# Altium footprint library Cty1.PcbLib: 869 footprints (part 10 of 55)
Each footprint in its own frame and in the unit in brackets; x right, y up, seen from the top. Pads: shape width x height; smd on the part's side, far side on the other; paste and mask are expansions set on the pad; w line width, h text height; cw(c..) or ccw(c..) is an arc to the next point about the centre after c.
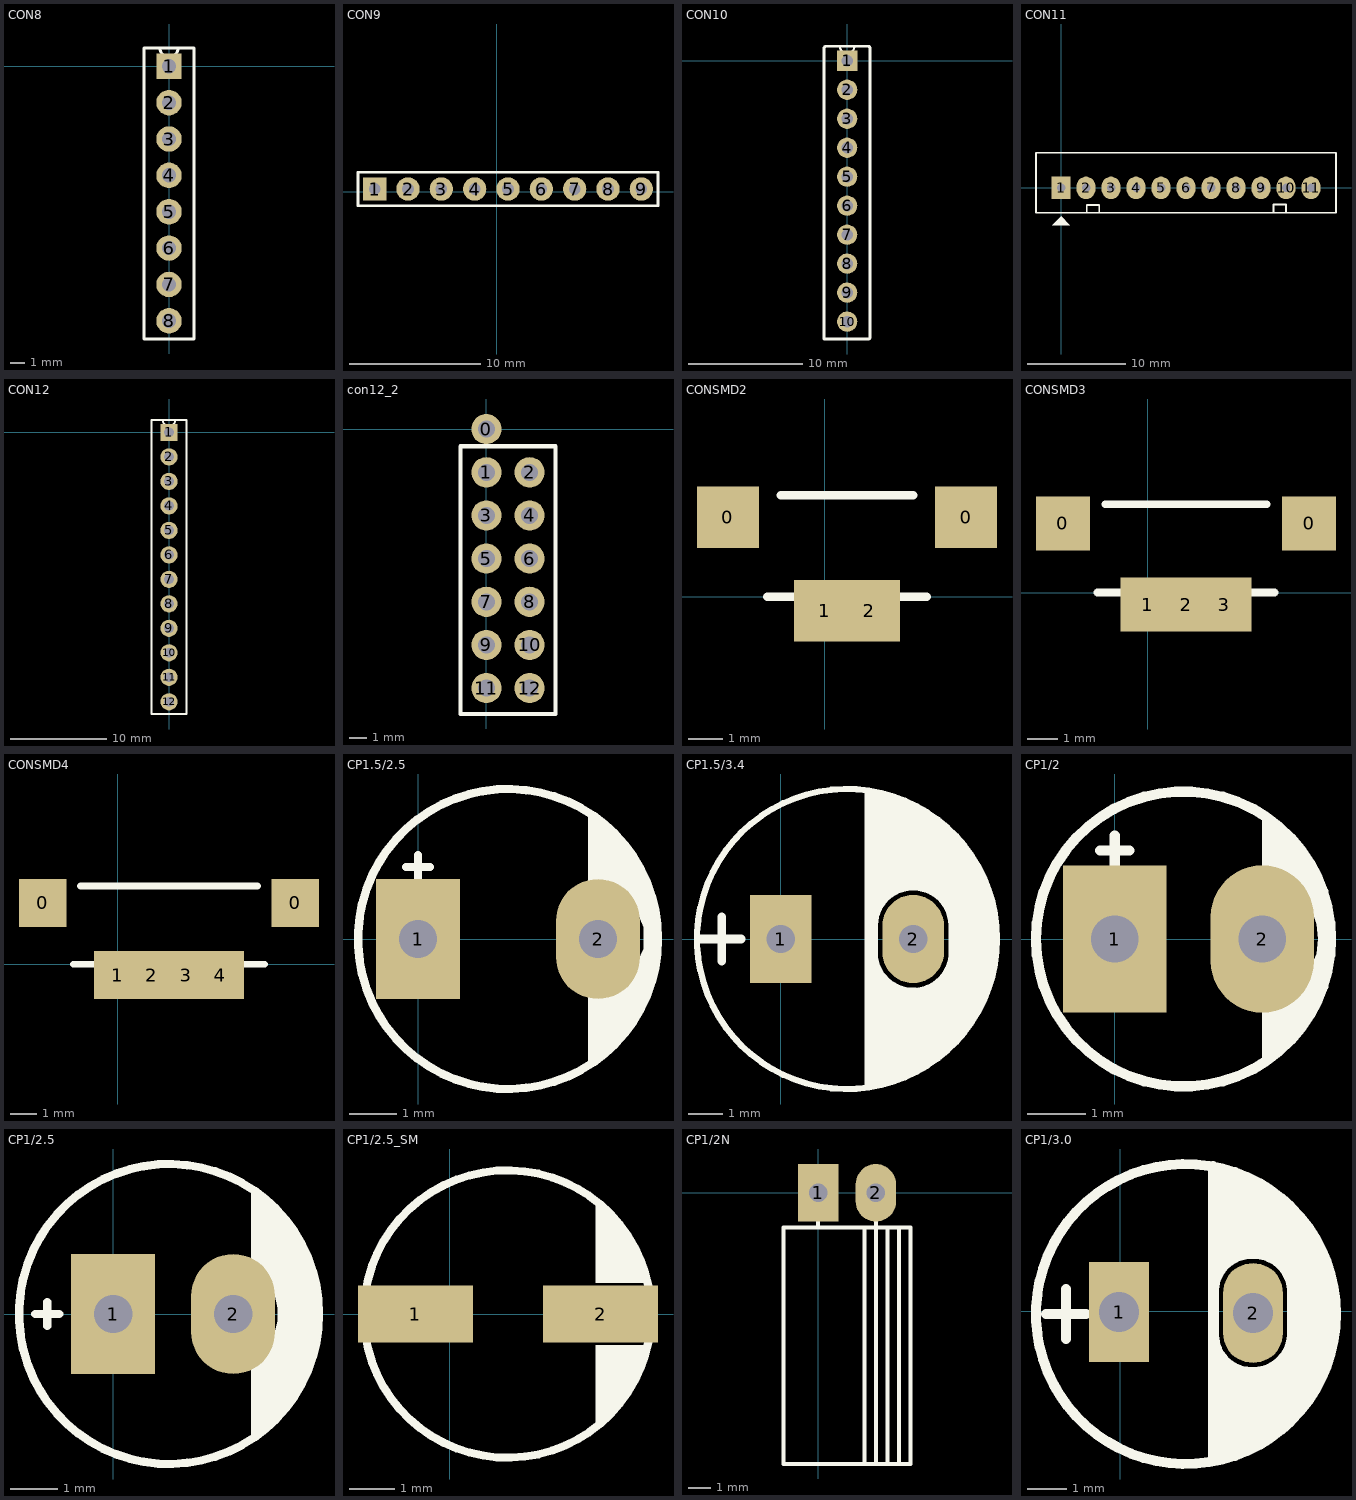
[diagram p9: the footprints below, top view; thin cyan lines are the x and y axes]

## CON8 [mil]
pads (8):
  rect 70x70 hole 39.37 unplated: 1(0,0)
  round 70 hole 39.37 unplated: 2(0,-100) 3(0,-200) 4(0,-300) 5(0,-400) 6(0,-500) 7(0,-600) 8(0,-700)
Top Overlay:
  lines w7.87: -68.31,-750 68.31,-750 68.31,50 -25,50 ccw(c0,50) 25,50 -68.31,50 -68.31,-750

## CON9 [mil]
pads (9):
  rect 70x70 hole 35 unplated: 1(-365.83,8.58)
  round 70 hole 35 unplated: 2(-265.83,8.58) 3(-165.83,8.58) 4(-65.83,8.58) 5(34.17,8.58) 6(134.17,8.58) 7(234.17,8.58) 8(334.17,8.58) 9(434.17,8.58)
Top Overlay:
  lines w7.87: -415.83,-41.42 484.17,-41.42 484.17,58.58 -415.83,58.58 -415.83,-41.42

## CON10 [mil]
pads (10):
  rect 70x70 hole 39.37 unplated: 1(0,0)
  round 70 hole 39.37 unplated: 2(0,-100) 3(0,-200) 4(0,-300) 5(0,-400) 6(0,-500) 7(0,-600) 8(0,-700) 9(0,-800) 10(0,-900)
Top Overlay:
  lines w7.87: -80,-960 60,-960 ; -72.24,50 25,50 cw(c0,50) -25,50 72.24,50
  lines w10: -72.24,50 ccw(c-72.24,42.24) -80,42.24 -80,-960 73.46,-960 ccw(c73.46,-954.72) 78.74,-954.72 78.74,43.5 ccw(c72.24,43.5) 72.24,50

## CON11 [mil] "CON11"
height 200
pads (11):
  rect 75x90 hole 34: 1(0,0)
  oval 75x90 hole 34: 2(100,0) 3(200,0) 4(300,0) 5(400,0) 6(500,0) 7(600,0) 8(700,0) 9(800,0) 10(900,0) 11(1000,0)
Top Overlay:
  region: -35.5,-149.5 35.5,-149.5 0.5,-114.5 0.5,-113.5
  lines w7: 103,-99 103,-69 153,-69 153,-99 ; 850,-97 850,-67 900,-67 900,-97 ; -100,-100 -100,140 1100,140 1100,0 1100,-100 -100,-100

## CON12 [mil]
pads (12):
  rect 70x70 hole 39.37 unplated: 1(0,0)
  round 70 hole 39.37 unplated: 2(0,-100) 3(0,-200) 4(0,-300) 5(0,-400) 6(0,-500) 7(0,-600) 8(0,-700) 9(0,-800) 10(0,-900) 11(0,-1000) 12(0,-1100)
Top Overlay:
  lines w7.87: -72.24,-1150 72.24,-1150 72.24,50 -25,50 ccw(c0,50) 25,50 -72.24,50 -72.24,-1150

## con12_2 [mil]
pads (13):
  round 70 hole 39.37 unplated: 0(0,0) 1(0,-100) 2(100,-100) 3(0,-200) 4(100,-200) 5(0,-300) 6(100,-300) 7(0,-400) 8(100,-400) 9(0,-500) 10(100,-500) 11(0,-600) 12(100,-600)
Top Overlay:
  lines w10: -60,-660 160,-660 160,-40 -60,-40 -60,-660

## CONSMD2 [mil]
pads (4):
  rect 70x70 smd: 0(-110,90) 0(160,90) 1(0,-15.75) 2(50,-15.75)
Top Overlay:
  lines w10: -65,0 -30,0 ; -50,115 100,115 ; 80,0 115,0

## CONSMD3 [mil]
pads (5):
  rect 70x70 smd: 0(-110,90) 0(210,90) 1(0,-15.75) 2(50,-15.75) 3(100,-15.75)
Top Overlay:
  lines w10: -65,0 -30,0 ; -55,115 155,115 ; 130,0 165,0

## CONSMD4 [mil]
pads (6):
  rect 70x70 smd: 0(-110,90) 0(260,90) 1(0,-15.75) 2(50,-15.75) 3(100,-15.75) 4(150,-15.75)
Top Overlay:
  lines w10: -65,0 -30,0 ; -55,115 205,115 ; 180,0 215,0

## CP1.5/2.5 [mil] "Tu hoa 33 >100 uF,50V, 220uF/16V,25V ( it su dung )"
height 300
pads (2):
  rect 70x100 hole 32: 1(0,0)
  oval 70x100 hole 32: 2(150,0)
Top Overlay:
  circle w7: c75,0 r125
  region: 142,106 142,39 156,39 173,35 182,25 188,10 188,-8 183,-19 183,-19.53 171,-33 155,-38 142,-41 142,-107 156,-96 177,-72 194,-40 199,-14 200,0 198,24 189,50 175,74 160,93
  lines w7: -10,60 10,60 ; 0,50 0,70
3D body: height 433.67, standoff -747.43, extent -46,-121.02 202.03,127.02

## CP1.5/3.4 [mil] "Tu hoa 220->470uF,16V, 470uF/16V,25V"
height 300
pads (2):
  rect 70x100 hole 32: 1(0,0)
  oval 70x100 hole 32: 2(150,0)
Top Overlay:
  circle w7: c75,0 r170
  region: 100,25 135,60 162.93,60 164.61,60 169.59,59.01 173.81,56.19 175,55 181.46,48.54 183.16,46.84 185,41.19 185,40 190,35 191.19,33.81 194.01,29.59 195,24.61 195,22.93 195,-27.93 195,-29.61 194.01,-34.59 191.19,-38.81 190,-40 178.54,-51.46 177.69,-52.31 174.71,-54.3 171.19,-55 170,-55 168.81,-56.19 164.59,-59.01 159.61,-60 157.93,-60 144.14,-60 141.9,-60 135.23,-59.12 126.92,-55.68 121.58,-51.58 120,-50 108.54,-38.54 107.69,-37.69 105.7,-34.71 105,-31.19 105,-30 100,-30 100,-170 155,-150 195,-120 225,-80 245,-20 245,20 230,70 200,115 165,145 120,165 100,170
  lines w10: -90,0 -45,0 ; -67,-25 -67,25 ; 100,-165 100,165 ; 100,25 105,25 ; 105,-20 105,30 ; 105,-10 ccw(c150,-15) 145,-60 ccw(c150,-15) 195,-20 195,15 ccw(c150,15) 150,60 ccw(c150,15) 105,15
3D body: height 445.89, standoff -754.41, extent -84.96,-157.48 230,157.48

## CP1/2 [mil] "Tu hoa < 22uF/16>50V"
height 300
pads (2):
  rect 70x100 hole 32: 1(0,0)
  oval 70x100 hole 32: 2(100,0)
Top Overlay:
  circle w7: c46.58,0 r100
  region: 100,84 100,38 112,36 122,32 129,27 134,19 137,10 138,0 137,-10 134,-17 129,-24 123,-31 117,-35 107,-38 100,-38 100,-85 108,-78 120,-69 128,-59 137,-44 144,-19 146,9 139,40 127,60 110,79
  lines w7: -10,60 10,60 ; 0,50 0,70
3D body: height 287.03, standoff -138.05, extent -49.42,-99.42 149.42,99.42

## CP1/2.5 [mil] "Tu hoa 33 >100 uF,50V, 220uF/16V,25V"
height 300
pads (2):
  rect 70x100 hole 32: 1(0,0)
  oval 70x100 hole 32: 2(100,0)
Top Overlay:
  circle w7: c46.58,0 r125
  region: 115,105 115,36 122,31 129,25 133,20 135,15 137,5 137,-6 135,-14 132,-19 128,-24 124,-28 120,-31 115,-34 115,-107 124,-99 139,-86 152,-69 167,-36 171,-15 171.58,0 167,30 153,67 131,93
  lines w7: -65,0 -45,0 ; -55,-10 -55,-5 -55,5 -55,10
3D body: height 421.54, standoff -759.57, extent -76,-124.03 172.03,124

## CP1/2.5_SM [mil] "Tu hoa SMD 33 >100 uF,50V, 220uF/16V,25V"
height 100
pads (2):
  rect 100x50 smd: 1(-30,0) 2(131,0)
Top Overlay:
  circle w7: c50,0 r125
  region: 127,98 127,27 172,27 173,9 170,-26 169.75,-27 127,-27 127,-98 141,-86 156,-67 170,-38 175,-19 175,18 170,37 162,58 146,82
  lines w7: -65,0 -45,0 ; -55,-10 -55,-5 -55,5 -55,10

## CP1/2N [mil] "Tu hoa < 22uF/16>50V"
height 300
pads (2):
  rect 70x100 hole 32: 1(0,0)
  oval 70x100 hole 32: 2(100,0)
Top Overlay:
  lines w7: 0,-60 0,-45 ; 80,-470 80,-60 ; 100,-470 100,-60 100,-45 ; 120,-470 120,-60 ; 140,-470 140,-60 ; -60,-470 -60,-60 160,-60 160,-470 -60,-470
3D body: height 199.43, standoff -136.22, extent -54.42,-351.27 144.43,15.7

## CP1/3.0 [mil]
pads (2):
  rect 60x100 hole 40: 1(-1,-1)
  oval 60x100 hole 40: 2(133,-2)
Top Overlay:
  circle w10: c66,-3 r150
  region: 93,146 93,37 121,58 143,58 165,42 174,-3 166,-43 141,-62 106,-53 92,-36 93,-150 152,-128 208,-60 216,16 185,93 139,129
  lines w10: -74,-3 -34,-3 ; -54,-28 -54,22 ; 93,-147 93,145 ; 94,-27 94,22 cw(c131.5,19.5) 131.01,57.08 ; 94,-25 ccw(c131.5,-23.5) 133,-61 ccw(c133.5,-22.5) 172,-23 ; 131,57 cw(c134,19) 172,22 ; 172,-30 172,25
3D body: height 452.87, standoff -747.43, extent -90,-162.48 224.96,152.48